# Altium footprint library Connector.PcbLib: 65 footprints (part 5 of 5)
Each footprint in its own frame and in the unit in brackets; x right, y up, seen from the top. Pads: shape width x height; smd on the part's side, far side on the other; paste and mask are expansions set on the pad; w line width, h text height; cw(c..) or ccw(c..) is an arc to the next point about the centre after c.
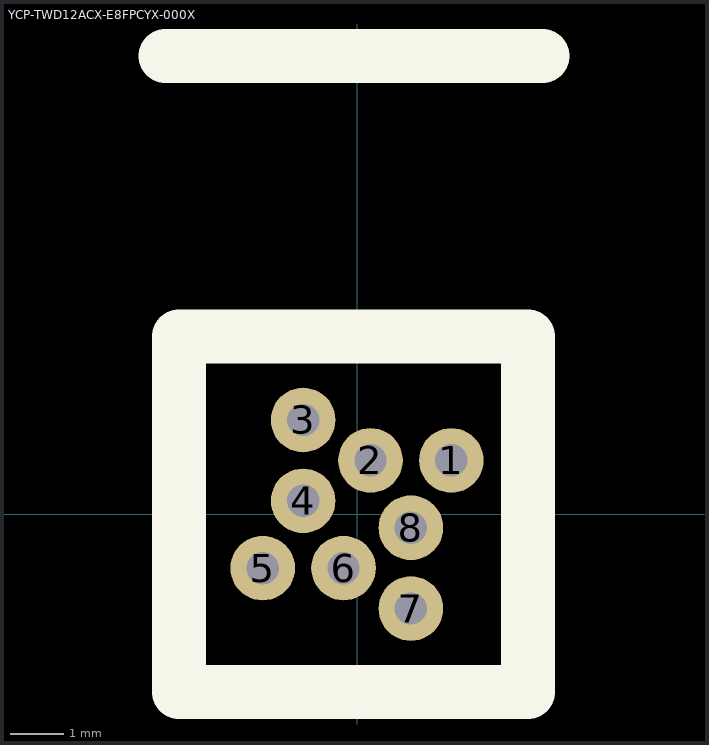
[diagram p4: the footprint, top view; thin cyan lines are the x and y axes]

## YCP-TWD12ACX-E8FPCYX-000X [mm]
pads (10):
  round 1.2 hole 0.6: 1(1.75,1) 2(0.25,1) 3(-1,1.75) 4(-1,0.25) 5(-1.75,-1) 6(-0.25,-1) 7(1,-1.75) 8(1,-0.25) ""(-1,0.25) ""(-1,1.75)
Top Overlay:
  lines w1: -3.556,8.509 3.444,8.509 ; -3.302,-3.302 3.175,-3.302 3.175,3.302 -3.302,3.302 -3.302,-3.302
3D body "YCP-TWD12ACX-E8FPCYX-000X.step": height 17.2, standoff -3.95, extent -7.937,-7.937 7.937,7.937